# Altium footprint library Cty1.PcbLib: 1378 footprints (part 54 of 87)
Each footprint in its own frame and in the unit in brackets; x right, y up, seen from the top. Pads: shape width x height; smd on the part's side, far side on the other; paste and mask are expansions set on the pad; w line width, h text height; cw(c..) or ccw(c..) is an arc to the next point about the centre after c.
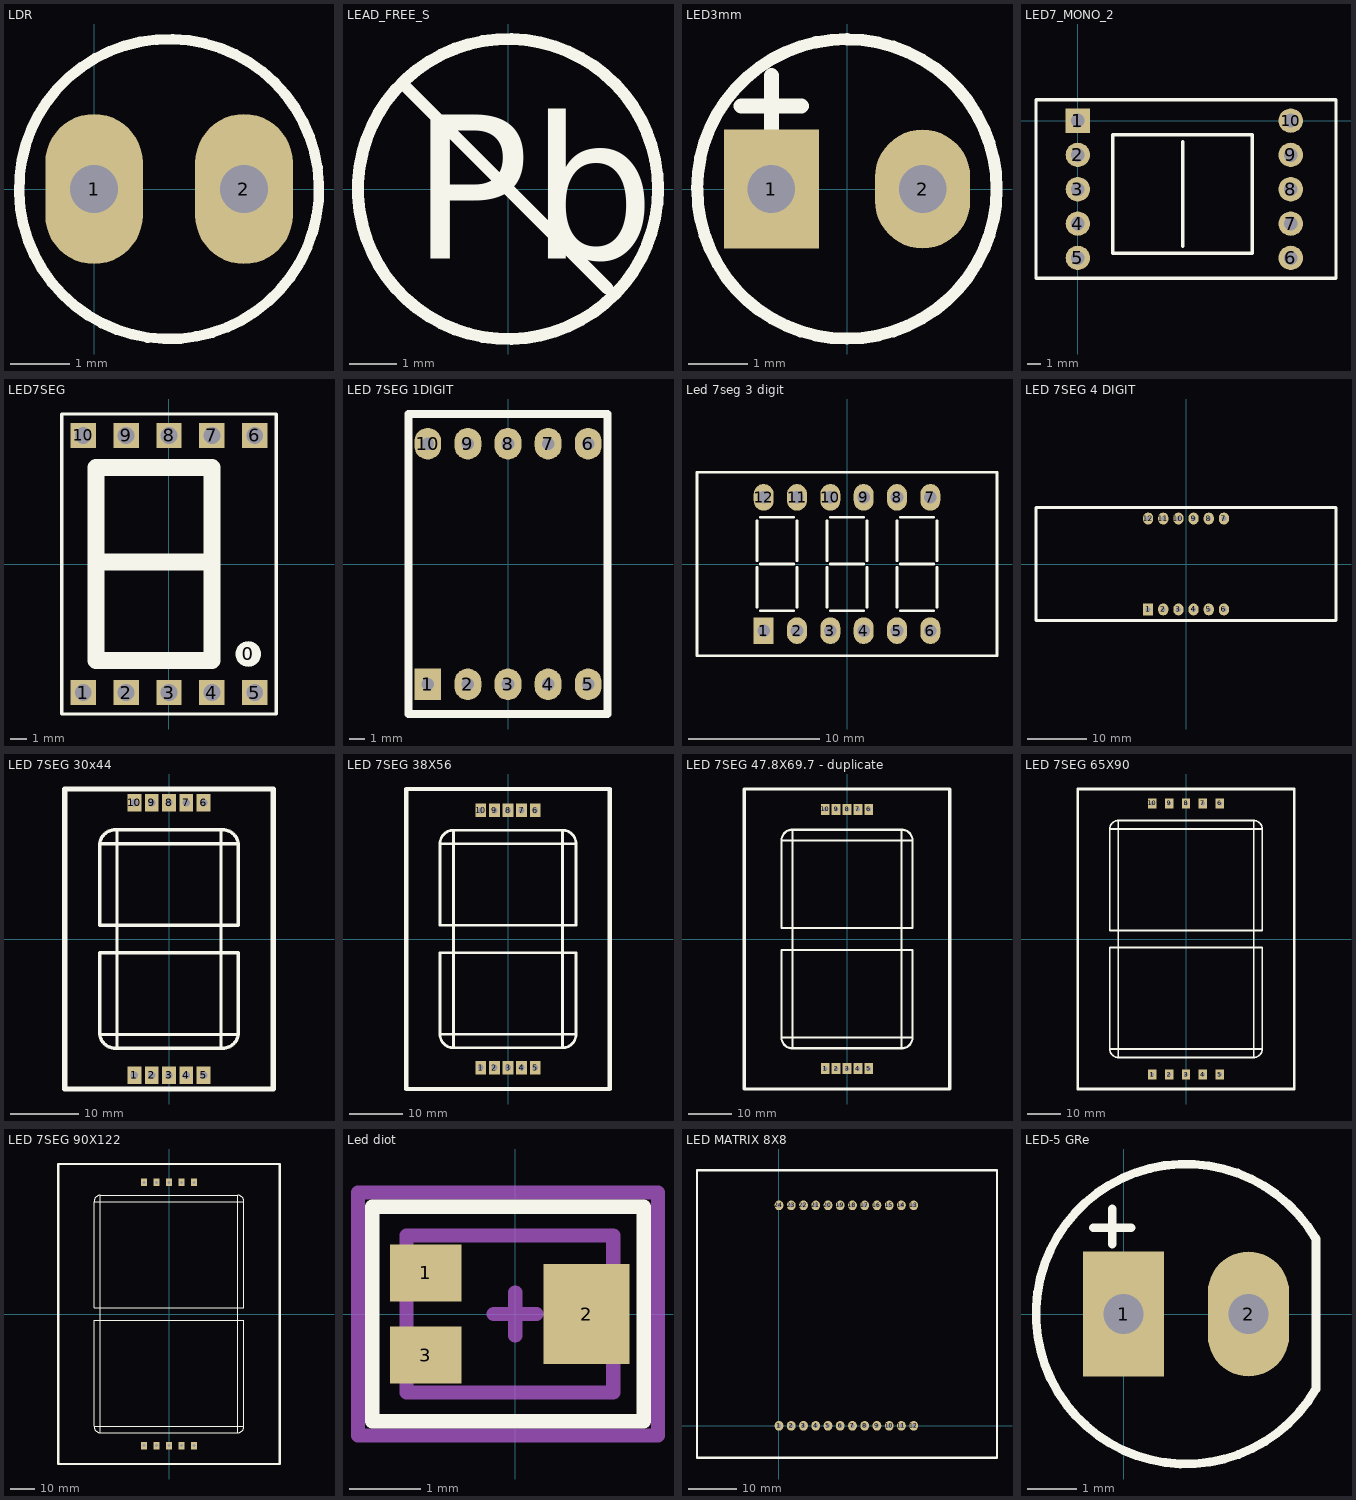
[diagram p53: the footprints below, top view; thin cyan lines are the x and y axes]

## LDR [mil] "QUANG TRO"
height 300
pads (2):
  oval 65x100 hole 32: 1(0,0) 2(100,0)
Top Overlay:
  lines w7: 136.62,-49.97 cw(c50,0) 137.42,-48.56
3D body "SW3dPS-Part7.STEP": height 88.19, standoff -98.43, extent -55,-82.64 150.12,86.64

## LEAD_FREE_S [mm]
Top Overlay:
  circle w0.254: c0,0 r3.172
  lines w0.254: -2.121,2.121 2.106,-2.106
  text "Pb" at -2.05,-1.47 h3.05

## LED3mm [mm]
pads (2):
  rect 1.6x2 hole 0.8: 1(-1.27,0)
  oval 1.6x2 hole 0.8: 2(1.27,0)
Top Overlay:
  lines w0.203: -2.521,0 cw(c0,0) 0,2.521 ; -2.514,0 ccw(c0,0) 0,-2.514 ccw(c0,0) 2.514,0 ccw(c0,0) 0,2.514
  lines w0.254: -1.778,1.397 -0.762,1.397 ; -1.27,0.889 -1.27,1.905
3D body "SW3DPS-REDLED-DIP.step": height 5.38, standoff -3.17, extent -1.992,-1.499 1.992,1.994

## LED7_MONO_2 [mm]
pads (10):
  rect 1.778x1.778 hole 1 unplated: 1(0,0)
  round 1.778 hole 1 unplated: 2(0,-2.5) 3(0,-5) 4(0,-7.5) 5(0,-10) 6(15.5,-10) 7(15.5,-7.5) 8(15.5,-5) 9(15.5,-2.5) 10(15.5,0)
Top Overlay:
  lines w0.2: -3.048,-11.484 -3.048,1.016 ; 18.796,-11.484 18.796,1.016
  lines w0.254: -3.048,-11.484 18.796,-11.484 ; -3.048,1.016 -3.048,1.524 18.796,1.524 18.796,1.016 ; 7.62,-9.144 7.62,-8.636 7.62,-1.524 ; 2.54,-9.652 12.7,-9.652 12.7,-1.016 2.54,-1.016 2.54,-9.652

## LED7SEG [mm] "LED7SEG"
pads (11):
  round 1.524 on Top Overlay: 0(4.724,-5.334)
  rect 1.5x1.5 hole 1: 1(-5.055,-7.62) 2(-2.515,-7.62) 3(0.025,-7.62) 4(2.565,-7.62) 5(5.105,-7.62) 6(5.105,7.62) 7(2.565,7.62) 8(0.025,7.62) 9(-2.515,7.62) 10(-5.055,7.62)
Top Overlay:
  lines w0.2: -6.325,-8.89 -6.325,8.89 6.375,8.89 6.375,-8.89 -6.325,-8.89
  lines w1: -4.166,0.127 2.565,0.127 ; -4.293,-5.715 2.565,-5.715 2.565,5.715 -4.293,5.715 -4.293,-5.715
3D body "SW3DPS-7SEGMENT DISPLAY.STEP": height 8.03, standoff -3.97, extent -6.35,-9.525 6.35,9.525

## LED 7SEG 1DIGIT [mm] "LED 7SEG 1DIGIT"
height 7.62
pads (10):
  rect 1.7x2 hole 0.8: 1(-5.08,-7.62)
  oval 1.7x2 hole 0.8: 2(-2.54,-7.62) 3(0,-7.62) 4(2.54,-7.62) 5(5.08,-7.62) 6(5.08,7.62) 7(2.54,7.62) 8(0,7.62) 9(-2.54,7.62) 10(-5.08,7.62)
Top Overlay:
  lines w0.5: -6.3,-9.5 -6.3,9.5 6.3,9.5 6.3,-9.5 -6.3,-9.5
3D body: height 8, standoff 0, extent -6.325,-9.576 6.274,9.423

## Led 7seg 3 digit [mil] "DIP; 14 Leads (2 Absent); Row Spacing 7.62 mm; Pitch 2.54 mm"
height 165.35
pads (12):
  rect 60x80 hole 38: 1(-250,-200)
  oval 60x80 hole 38: 2(-150,-200) 3(-50,-200) 4(50,-200) 5(150,-200) 6(250,-200) 7(250,200) 8(150,200) 9(50,200) 10(-50,200) 11(-150,200) 12(-250,200)
Top Overlay:
  lines w8: -270,-130 -270,-10 ; -270,10 -270,130 ; -260,-140 -160,-140 ; -260,0 -160,0 ; -260,140 -160,140 ; -150,-130 -150,-10 ; -150,10 -150,130 ; -60,-130 -60,-10 ; -60,10 -60,130 ; -50,-140 50,-140 ; -50,0 50,0 ; -50,140 50,140 ; 60,-130 60,-10 ; 60,10 60,130 ; 150,-130 150,-10 ; 150,10 150,130 ; 160,-140 260,-140 ; 160,0 260,0 ; 160,140 260,140 ; 270,-130 270,-10 ; 270,10 270,130 ; -450,-275 -450,275 450,275 450,-275 -450,-275

## LED 7SEG 4 DIGIT [mm] "LED 7SEG 4DIGIT"
height 7.62
pads (12):
  rect 1.7x2 hole 0.8: 1(-6.35,-7.62)
  oval 1.7x2 hole 0.8: 2(-3.81,-7.62) 3(-1.27,-7.62) 4(1.27,-7.62) 5(3.81,-7.62) 6(6.35,-7.62) 7(6.35,7.62) 8(3.81,7.62) 9(1.27,7.62) 10(-1.27,7.62) 11(-3.81,7.62) 12(-6.35,7.62)
Top Overlay:
  lines w0.5: -25.15,-9.5 -25.15,9.5 25.15,9.5 25.15,-9.5 -25.15,-9.5
3D body: height 8, standoff 0, extent -25.121,-9.5 25.121,9.474

## LED 7SEG 30x44 [mil]
pads (10):
  rect 80x100 hole 42: 1(-200,-787.4) 2(-100,-787.4) 3(0,-787.4) 4(100,-787.4) 5(200,-787.4) 6(200,787.4) 7(100,787.4) 8(0,787.4) 9(-100,787.4) 10(-200,787.4)
Top Overlay:
  lines w19.68: -300,-100 -300,100 ; -300,-78.74 -300,-629.92 ; -300,78.74 -300,629.92 ; 300,-100 300,100 ; 300,-78.74 300,-629.92 ; 300,78.74 300,629.92 ; -400,-551.18 ccw(c-310.63,-540.55) -300,-629.92 ; -400,-551.18 -400,-78.74 400,-78.74 400,-472.44 400,-551.18 ; -400,-551.18 400,-551.18 ; -400,551.18 cw(c-310.63,540.55) -300,629.92 ; -400,551.18 -400,78.74 400,78.74 400,551.18 ; -400,551.18 400,551.18 ; -300,-629.92 300,-629.92 ; -300,629.92 300,629.92 ; 300,-629.92 ccw(c310.63,-540.55) 400,-551.18 ; 300,629.92 cw(c310.63,540.55) 400,551.18
  lines w31.5: -602.36,-866.14 602.36,-866.14 602.36,866.14 -602.36,866.14 -602.36,-866.14
3D body "Part1.STEP": height 354.33, standoff -98.43, extent -602.36,-866.14 602.37,866.14

## LED 7SEG 38X56 [mil]
pads (10):
  rect 80x100 hole 42: 1(-200,-944.88) 2(-100,-944.88) 3(0,-944.88) 4(100,-944.88) 5(200,-944.88) 6(200,944.88) 7(100,944.88) 8(0,944.88) 9(-100,944.88) 10(-200,944.88)
Top Overlay:
  lines w19.68: -500,-700 ccw(c-400,-700) -400,-800 ; -500,-700 400,-700 500,-700 ; -500,-700 -500,-100 500,-100 500,-700 ; -500,700 cw(c-400,700) -400,800 ; -500,700 500,700 ; -500,700 -500,100 500,100 500,700 ; -400,-800 -400,-100 -400,100 -400,800 ; -400,-800 400,-800 ; -400,800 400,800 ; 400,-800 ccw(c400,-700) 500,-700 ; 400,-800 400,-100 400,100 400,800 ; 400,800 cw(c400,700) 500,700
  lines w31.5: -748.03,-1102.36 748.03,-1102.36 748.03,1102.36 -748.03,1102.36 -748.03,-1102.36

## LED 7SEG 47.8X69.7 - duplicate [mil]
pads (10):
  rect 80x100 hole 42: 1(-200,-1185.04) 2(-100,-1185.04) 3(0,-1185.04) 4(100,-1185.04) 5(200,-1185.04) 6(200,1185.04) 7(100,1185.04) 8(0,1185.04) 9(-100,1185.04) 10(-200,1185.04)
Top Overlay:
  lines w19.68: -600,-900 ccw(c-500,-900) -500,-1000 ; -600,-900 600,-900 ; -600,-900 -600,-100 600,-100 600,-900 ; -600,900 cw(c-500,900) -500,1000 ; -600,900 600,900 ; -600,900 -600,100 -500,100 600,100 600,900 ; -500,-1000 -500,1000 ; -500,-1000 500,-1000 ; -500,1000 500,1000 ; 500,-1000 ccw(c500,-900) 600,-900 ; 500,-1000 500,1000 ; 500,1000 cw(c500,900) 600,900
  lines w31.5: -940.94,-1372.05 -940.94,1372.05 940.94,1372.05 940.94,-1372.05 -940.94,-1372.05

## LED 7SEG 65X90 [mm]
pads (10):
  rect 2.54x3.048 hole 1.27: 1(-10.16,-40.65) 2(-5.08,-40.65) 3(0,-40.65) 4(5.08,-40.65) 5(10.16,-40.65) 6(10.16,40.65) 7(5.08,40.65) 8(0,40.65) 9(-5.08,40.65) 10(-10.16,40.65)
Top Overlay:
  lines w0.5: -22.86,-33.02 ccw(c-20.32,-33.02) -20.32,-35.56 ; -22.86,-33.02 22.86,-33.02 ; -22.86,-33.02 -22.86,-2.54 22.86,-2.54 22.86,-33.02 ; -22.86,33.02 cw(c-20.32,33.02) -20.32,35.56 ; -22.86,33.02 22.86,33.02 ; -22.86,33.02 -22.86,2.54 22.86,2.54 22.86,33.02 ; -20.32,-35.56 -20.32,35.56 ; -20.32,-35.56 20.32,-35.56 ; -20.32,35.56 20.32,35.56 ; 20.32,-35.56 ccw(c20.32,-33.02) 22.86,-33.02 ; 20.32,-35.56 20.32,35.56 ; 20.32,35.56 cw(c20.32,33.02) 22.86,33.02
  lines w0.8: -32.5,-45 32.5,-45 32.5,45 -32.5,45 -32.5,-45

## LED 7SEG 90X122 [mm]
pads (11):
  rect 2.54x3.048 hole 1.27: 1(-10.16,-53.5) 2(-5.08,-53.5) 3(0,-53.5) 4(5.08,-53.5) 5(10.16,-53.5) 6(10.16,53.5) 7(5.08,53.5) 8(0,53.5) 9(-5.08,53.5) 10(-10.16,53.5) 11(-10.16,53.5)
Top Overlay:
  lines w0.5: -30.48,5.08 -30.48,45.72 ; -30.48,7.62 -30.48,2.54 -25.4,2.54 ; -27.94,2.54 30.48,2.54 30.48,45.72 ; -30.48,-45.72 ccw(c-27.94,-45.72) -27.94,-48.26 ; -30.48,-45.72 -30.48,-2.54 30.48,-2.54 30.48,-45.72 ; -30.48,-45.72 27.94,-45.72 30.48,-45.72 ; -30.48,45.72 cw(c-27.94,45.72) -27.94,48.26 ; -30.48,45.72 30.48,45.72 ; -27.94,-48.26 27.94,-48.26 ; -27.94,-48.26 -27.94,48.26 ; -27.94,48.26 27.94,48.26 ; 27.94,-48.26 ccw(c27.94,-45.72) 30.48,-45.72 ; 27.94,-48.26 27.94,48.26 ; 27.94,48.26 cw(c27.94,45.72) 30.48,45.72
  lines w1: -45,-61 45,-61 45,61 -45,61 -45,-61

## Led diot [mm]
pads (3):
  rect 1x0.8 smd mask+0.01: 1(-1.25,0.575) 3(-1.25,-0.575)
  rect 1.2x1.4 smd mask+0.01: 2(1,0)
Top Overlay:
  lines w0.2: -2,-1.5 1.8,-1.5 1.8,1.5 -2,1.5 -2,-1.5
Mechanical 13:
  lines w0.2: -1.521,-1.1 1.375,-1.1 1.375,1.1 -1.521,1.1 -1.521,-1.1
Mechanical 15:
  lines w0.2: -0.3,0 0.3,0 ; 0,-0.3 0,0.3 ; -2.2,-1.7 -2.2,1.7 2,1.7 2,-1.7 -2.2,-1.7
3D body "3302X-3-103.STEP": height 1.1, standoff 0, extent -1.521,-1.1 1.375,1.1

## LED MATRIX 8X8 [mm]
pads (24):
  oval 1.8x2 hole 0.9: 1(0,0) 2(2.54,0) 3(5.08,0) 4(7.62,0) 5(10.16,0) 6(12.7,0) 7(15.24,0) 8(17.78,0) 9(20.32,0) 10(22.86,0) 11(25.4,0) 12(27.94,0) 13(27.94,45.72) 14(25.4,45.72) 15(22.86,45.72) 16(20.32,45.72) 17(17.78,45.72) 18(15.24,45.72) 19(12.7,45.72) 20(10.16,45.72) 21(7.62,45.72) 22(5.08,45.72) 23(2.54,45.72) 24(0,45.72)
Top Overlay:
  lines w0.5: -17.006,-6.65 -17.006,53.04 -2.401,53.04 45.224,53.04 45.224,-6.65 -17.006,-6.65

## LED-5 GRe [mil] "LED 2 PIN, 5 ly , Only colour,pin to pin 100mil"
height 300
pads (2):
  rect 65x100 hole 32: 1(0,0)
  oval 65x100 hole 32: 2(100,0)
Top Overlay:
  lines w7: -24,69 6,69 ; -9,56 -9,84 ; 153.51,60.71 ccw(c50,0) 153.94,-59.97 ; 154,-59 154,60
3D body "SW3dPS-LED green.STEP": height 336.82, standoff -117.51, extent -54.33,-103.65 154.33,105.01